# Altium schematic symbol library Capacitor - Ceramic - Sumsung.SchLib: 1421 symbols (part 5 of 8) (continued)
## CL21C102JDFNFNE (continued)
CAP CER 1000PF 200V NP0 0805; Part Number: CL21C102JDFNFNE; Manufacturer: Samsung Electro-Mechanics America, Inc.; TemperatureRange: -55C ~ 125C; TemperatureCoefficient: C0G, NP0; Tolerance: 5%; Value: 1000pF; PartId: 5983; Supplier 1: Digi-Key; Supplier Part Number 1: 1276-2982-2-ND; ComponentLink1Description: Datasheet; ComponentLink1URL: http://www.samsungsem.com/kr/support/product-search/mlcc/CL21C102JDFNFNE.jsp; ComponentLink2Description: Digi-Key listing; ComponentLink2URL: http://digikey.com/product-detail/en/CL21C102JDFNFNE/1276-2982-2-ND/3888640; Voltage: 200V; Price: 0.065; Type: -; Device Package: 0805 (2012 Metric)
footprint CAP 0805/2012
pins: 1, 2

## CL21C103JBFNNNE
designator C?, comment 10000pF
CAP CER 10000PF 50V NP0 0805; Part Number: CL21C103JBFNNNE; Manufacturer: Samsung Electro-Mechanics America, Inc.; TemperatureRange: -55C ~ 125C; TemperatureCoefficient: C0G, NP0; Tolerance: 5%; Value: 10000pF; PartId: 6062; Supplier 1: Digi-Key; Supplier Part Number 1: 1276-2984-2-ND; ComponentLink1Description: Datasheet; ComponentLink1URL: http://www.samsungsem.com/kr/support/product-search/mlcc/CL21C103JBFNNNE.jsp; ComponentLink2Description: Digi-Key listing; ComponentLink2URL: http://digikey.com/product-detail/en/CL21C103JBFNNNE/1276-2984-2-ND/3888642; Voltage: 50V; Price: 0.0947; Type: -; Device Package: 0805 (2012 Metric)
footprint CAP 0805/2012
pins: 1, 2

## CL21C120FBANNNC
designator C?, comment 12pF
CAP CER 12PF 50V NP0 0805; Part Number: CL21C120FBANNNC; Manufacturer: Samsung Electro-Mechanics America, Inc.; TemperatureRange: -55C ~ 125C; TemperatureCoefficient: C0G, NP0; Tolerance: 1%; Value: 12pF; PartId: 5882; Supplier 1: Digi-Key; Supplier Part Number 1: 1276-2579-2-ND; ComponentLink1Description: Datasheet; ComponentLink1URL: http://media.digikey.com/pdf/Data%20Sheets/Samsung%20PDFs/CL21C120FBANNNC_Spec.pdf; ComponentLink2Description: Digi-Key listing; ComponentLink2URL: http://digikey.com/product-detail/en/CL21C120FBANNNC/1276-2579-2-ND/3888237; Voltage: 50V; Price: 0.0318; Type: -; Device Package: 0805 (2012 Metric)
footprint CAP 0805/2012
pins: 1, 2

## CL21C120JBANNNC
designator C?, comment 12pF
CAP CER 12PF 50V NP0 0805; Part Number: CL21C120JBANNNC; Manufacturer: Samsung Electro-Mechanics America, Inc.; TemperatureRange: -55C ~ 125C; TemperatureCoefficient: C0G, NP0; Tolerance: 5%; Value: 12pF; PartId: 5709; Supplier 1: Digi-Key; Supplier Part Number 1: 1276-1120-2-ND; ComponentLink1Description: Datasheet; ComponentLink1URL: http://www.samsungsem.com/kr/support/product-search/mlcc/CL21C120JBANNNC.jsp; ComponentLink2Description: Digi-Key listing; ComponentLink2URL: http://digikey.com/product-detail/en/CL21C120JBANNNC/1276-1120-2-ND/3886778; Voltage: 50V; Price: 0.0132; Type: -; Device Package: 0805 (2012 Metric)
footprint CAP 0805/2012
pins: 1, 2

## CL21C121JDCNNNC
designator C?, comment 120pF
CAP CER 120PF 200V NP0 0805; Part Number: CL21C121JDCNNNC; Manufacturer: Samsung Electro-Mechanics America, Inc.; TemperatureRange: -55C ~ 125C; TemperatureCoefficient: C0G, NP0; Tolerance: 5%; Value: 120pF; PartId: 5898; Supplier 1: Digi-Key; Supplier Part Number 1: 1276-1201-2-ND; ComponentLink1Description: Datasheet; ComponentLink1URL: http://www.samsungsem.com/kr/support/product-search/mlcc/CL21C121JDCNNNC.jsp; ComponentLink2Description: Digi-Key listing; ComponentLink2URL: http://digikey.com/product-detail/en/CL21C121JDCNNNC/1276-1201-2-ND/3886859; Voltage: 200V; Price: 0.0343; Type: -; Device Package: 0805 (2012 Metric)
footprint CAP 0805/2012
pins: 1, 2

## CL21C122FBFNNWE
designator C?, comment 1200pF
CAP CER 1200PF 50V NP0 0805; Part Number: CL21C122FBFNNWE; Manufacturer: Samsung Electro-Mechanics America, Inc.; TemperatureRange: -55C ~ 125C; TemperatureCoefficient: C0G, NP0; Tolerance: 1%; Value: 1200pF; PartId: 6129; Supplier 1: Digi-Key; Supplier Part Number 1: 1276-2985-2-ND; ComponentLink1Description: Datasheet; ComponentLink1URL: http://www.samsungsem.com/global/front/downloadcms.do?path=%2F%2Fglobal%2F%2Fsupport%2F%2Flibrary%2F%2Fproduct-catalog%2F%2F__icsFiles%2F%2Fafieldfile%2F%2F2015%2F%2F11%2F%2F18&fileName=MLCC_1.pdf; ComponentLink2Description: Digi-Key listing; ComponentLink2URL: http://digikey.com/product-detail/en/CL21C122FBFNNWE/1276-2985-2-ND/3888643; Voltage: 50V; Price: 0.2127; Type: -; Device Package: 0805 (2012 Metric)
footprint CAP 0805/2012
pins: 1, 2

## CL21C122JBFNNNE
designator C?, comment 1200pF
CAP CER 1200PF 50V NP0 0805; Part Number: CL21C122JBFNNNE; Manufacturer: Samsung Electro-Mechanics America, Inc.; TemperatureRange: -55C ~ 125C; TemperatureCoefficient: C0G, NP0; Tolerance: 5%; Value: 1200pF; PartId: 5886; Supplier 1: Digi-Key; Supplier Part Number 1: 1276-2986-2-ND; ComponentLink1Description: Datasheet; ComponentLink1URL: http://www.samsungsem.com/kr/support/product-search/mlcc/CL21C122JBFNNNE.jsp; ComponentLink2Description: Digi-Key listing; ComponentLink2URL: http://digikey.com/product-detail/en/CL21C122JBFNNNE/1276-2986-2-ND/3888644; Voltage: 50V; Price: 0.032; Type: -; Device Package: 0805 (2012 Metric)
footprint CAP 0805/2012
pins: 1, 2

## CL21C130JBANNNC
designator C?, comment 13pF
CAP CER 13PF 50V NP0 0805; Part Number: CL21C130JBANNNC; Manufacturer: Samsung Electro-Mechanics America, Inc.; TemperatureRange: -55C ~ 125C; TemperatureCoefficient: C0G, NP0; Tolerance: 5%; Value: 13pF; PartId: 5672; Supplier 1: Digi-Key; Supplier Part Number 1: 1276-2582-2-ND; ComponentLink1Description: Datasheet; ComponentLink1URL: http://www.samsungsem.com/kr/support/product-search/mlcc/CL21C130JBANNNC.jsp; ComponentLink2Description: Digi-Key listing; ComponentLink2URL: http://digikey.com/product-detail/en/CL21C130JBANNNC/1276-2582-2-ND/3888240; Voltage: 50V; Price: 0.0054; Type: -; Device Package: 0805 (2012 Metric)
footprint CAP 0805/2012
pins: 1, 2

## CL21C140JBANNNC
designator C?, comment 14pF
CAP CER 14PF 50V NP0 0805; Part Number: CL21C140JBANNNC; Manufacturer: Samsung Electro-Mechanics America, Inc.; TemperatureRange: -55C ~ 125C; TemperatureCoefficient: C0G, NP0; Tolerance: 5%; Value: 14pF; PartId: 5683; Supplier 1: Digi-Key; Supplier Part Number 1: 1276-2584-2-ND; ComponentLink1Description: Datasheet; ComponentLink1URL: http://www.samsungsem.com/kr/support/product-search/mlcc/CL21C140JBANNNC.jsp; ComponentLink2Description: Digi-Key listing; ComponentLink2URL: http://digikey.com/product-detail/en/CL21C140JBANNNC/1276-2584-2-ND/3888242; Voltage: 50V; Price: 0.0061; Type: -; Device Package: 0805 (2012 Metric)
footprint CAP 0805/2012
pins: 1, 2

## CL21C150JBANNNC
designator C?, comment 15pF
CAP CER 15PF 50V NP0 0805; Part Number: CL21C150JBANNNC; Manufacturer: Samsung Electro-Mechanics America, Inc.; TemperatureRange: -55C ~ 125C; TemperatureCoefficient: C0G, NP0; Tolerance: 5%; Value: 15pF; PartId: 5747; Supplier 1: Digi-Key; Supplier Part Number 1: 1276-1163-2-ND; ComponentLink1Description: Datasheet; ComponentLink1URL: http://www.samsungsem.com/kr/support/product-search/mlcc/CL21C150JBANNNC.jsp; ComponentLink2Description: Digi-Key listing; ComponentLink2URL: http://digikey.com/product-detail/en/CL21C150JBANNNC/1276-1163-2-ND/3886821; Voltage: 50V; Price: 0.0163; Type: -; Device Package: 0805 (2012 Metric)
footprint CAP 0805/2012
pins: 1, 2

## CL21C150JCANNNC
designator C?, comment 15pF
CAP CER 15PF 100V NP0 0805; Part Number: CL21C150JCANNNC; Manufacturer: Samsung Electro-Mechanics America, Inc.; TemperatureRange: -55C ~ 125C; TemperatureCoefficient: C0G, NP0; Tolerance: 5%; Value: 15pF; PartId: 5838; Supplier 1: Digi-Key; Supplier Part Number 1: 1276-2587-2-ND; ComponentLink1Description: Datasheet; ComponentLink1URL: http://www.samsungsem.com/kr/support/product-search/mlcc/CL21C150JCANNNC.jsp; ComponentLink2Description: Digi-Key listing; ComponentLink2URL: http://digikey.com/product-detail/en/CL21C150JCANNNC/1276-2587-2-ND/3888245; Voltage: 100V; Price: 0.0235; Type: -; Device Package: 0805 (2012 Metric)
footprint CAP 0805/2012
pins: 1, 2

## CL21C151GBANNNC
designator C?, comment 150pF
CAP CER 150PF 50V NP0 0805; Part Number: CL21C151GBANNNC; Manufacturer: Samsung Electro-Mechanics America, Inc.; TemperatureRange: -55C ~ 125C; TemperatureCoefficient: C0G, NP0; Tolerance: 2%; Value: 150pF; PartId: 5933; Supplier 1: Digi-Key; Supplier Part Number 1: 1276-2589-2-ND; ComponentLink1Description: Datasheet; ComponentLink1URL: http://www.samsungsem.com/kr/support/product-search/mlcc/CL21C151GBANNNC.jsp; ComponentLink2Description: Digi-Key listing; ComponentLink2URL: http://digikey.com/product-detail/en/CL21C151GBANNNC/1276-2589-2-ND/3888247; Voltage: 50V; Price: 0.043; Type: -; Device Package: 0805 (2012 Metric)
footprint CAP 0805/2012
pins: 1, 2

## CL21C151JCANNNC
designator C?, comment 150pF
CAP CER 150PF 100V NP0 0805; Part Number: CL21C151JCANNNC; Manufacturer: Samsung Electro-Mechanics America, Inc.; TemperatureRange: -55C ~ 125C; TemperatureCoefficient: C0G, NP0; Tolerance: 5%; Value: 150pF; PartId: 5896; Supplier 1: Digi-Key; Supplier Part Number 1: 1276-2591-2-ND; ComponentLink1Description: Datasheet; ComponentLink1URL: http://www.samsungsem.com/kr/support/product-search/mlcc/CL21C151JCANNNC.jsp; ComponentLink2Description: Digi-Key listing; ComponentLink2URL: http://digikey.com/product-detail/en/CL21C151JCANNNC/1276-2591-2-ND/3888249; Voltage: 100V; Price: 0.034; Type: -; Device Package: 0805 (2012 Metric)
footprint CAP 0805/2012
pins: 1, 2

## CL21C160JBANNNC
designator C?, comment 16pF
CAP CER 16PF 50V NP0 0805; Part Number: CL21C160JBANNNC; Manufacturer: Samsung Electro-Mechanics America, Inc.; TemperatureRange: -55C ~ 125C; TemperatureCoefficient: C0G, NP0; Tolerance: 5%; Value: 16pF; PartId: 5674; Supplier 1: Digi-Key; Supplier Part Number 1: 1276-2592-2-ND; ComponentLink1Description: Datasheet; ComponentLink1URL: http://www.samsungsem.com/kr/support/product-search/mlcc/CL21C160JBANNNC.jsp; ComponentLink2Description: Digi-Key listing; ComponentLink2URL: http://digikey.com/product-detail/en/CL21C160JBANNNC/1276-2592-2-ND/3888250; Voltage: 50V; Price: 0.0054; Type: -; Device Package: 0805 (2012 Metric)
footprint CAP 0805/2012
pins: 1, 2

## CL21C161JBANNNC
designator C?, comment 160pF
CAP CER 160PF 50V NP0 0805; Part Number: CL21C161JBANNNC; Manufacturer: Samsung Electro-Mechanics America, Inc.; TemperatureRange: -55C ~ 125C; TemperatureCoefficient: C0G, NP0; Tolerance: 5%; Value: 160pF; PartId: 5817; Supplier 1: Digi-Key; Supplier Part Number 1: 1276-2593-2-ND; ComponentLink1Description: Datasheet; ComponentLink1URL: http://www.samsungsem.com/kr/support/product-search/mlcc/CL21C161JBANNNC.jsp; ComponentLink2Description: Digi-Key listing; ComponentLink2URL: http://digikey.com/product-detail/en/CL21C161JBANNNC/1276-2593-2-ND/3888251; Voltage: 50V; Price: 0.0211; Type: -; Device Package: 0805 (2012 Metric)
footprint CAP 0805/2012
pins: 1, 2

## CL21C180JBANNNC
designator C?, comment 18pF
CAP CER 18PF 50V NP0 0805; Part Number: CL21C180JBANNNC; Manufacturer: Samsung Electro-Mechanics America, Inc.; TemperatureRange: -55C ~ 125C; TemperatureCoefficient: C0G, NP0; Tolerance: 5%; Value: 18pF; PartId: 5707; Supplier 1: Digi-Key; Supplier Part Number 1: 1276-1107-2-ND; ComponentLink1Description: Datasheet; ComponentLink1URL: http://www.samsungsem.com/kr/support/product-search/mlcc/CL21C180JBANNNC.jsp; ComponentLink2Description: Digi-Key listing; ComponentLink2URL: http://digikey.com/product-detail/en/CL21C180JBANNNC/1276-1107-2-ND/3886765; Voltage: 50V; Price: 0.0132; Type: -; Device Package: 0805 (2012 Metric)
footprint CAP 0805/2012
pins: 1, 2

## CL21C181JBANNNC
designator C?, comment 180pF
CAP CER 180PF 50V NP0 0805; Part Number: CL21C181JBANNNC; Manufacturer: Samsung Electro-Mechanics America, Inc.; TemperatureRange: -55C ~ 125C; TemperatureCoefficient: C0G, NP0; Tolerance: 5%; Value: 180pF; PartId: 5785; Supplier 1: Digi-Key; Supplier Part Number 1: 1276-1129-2-ND; ComponentLink1Description: Datasheet; ComponentLink1URL: http://www.samsungsem.com/kr/support/product-search/mlcc/CL21C181JBANNNC.jsp; ComponentLink2Description: Digi-Key listing; ComponentLink2URL: http://digikey.com/product-detail/en/CL21C181JBANNNC/1276-1129-2-ND/3886787; Voltage: 50V; Price: 0.0173; Type: -; Device Package: 0805 (2012 Metric)
footprint CAP 0805/2012
pins: 1, 2

## CL21C200JBANNNC
designator C?, comment 20pF
CAP CER 20PF 50V NP0 0805; Part Number: CL21C200JBANNNC; Manufacturer: Samsung Electro-Mechanics America, Inc.; TemperatureRange: -55C ~ 125C; TemperatureCoefficient: C0G, NP0; Tolerance: 5%; Value: 20pF; PartId: 5751; Supplier 1: Digi-Key; Supplier Part Number 1: 1276-1829-2-ND; ComponentLink1Description: Datasheet; ComponentLink1URL: http://www.samsungsem.com/kr/support/product-search/mlcc/CL21C200JBANNNC.jsp; ComponentLink2Description: Digi-Key listing; ComponentLink2URL: http://digikey.com/product-detail/en/CL21C200JBANNNC/1276-1829-2-ND/3887487; Voltage: 50V; Price: 0.0163; Type: -; Device Package: 0805 (2012 Metric)
footprint CAP 0805/2012
pins: 1, 2

## CL21C201JBANNNC
designator C?, comment 200pF
CAP CER 200PF 50V NP0 0805; Part Number: CL21C201JBANNNC; Manufacturer: Samsung Electro-Mechanics America, Inc.; TemperatureRange: -55C ~ 125C; TemperatureCoefficient: C0G, NP0; Tolerance: 5%; Value: 200pF; PartId: 5798; Supplier 1: Digi-Key; Supplier Part Number 1: 1276-2601-2-ND; ComponentLink1Description: Datasheet; ComponentLink1URL: http://www.samsungsem.com/kr/support/product-search/mlcc/CL21C201JBANNNC.jsp; ComponentLink2Description: Digi-Key listing; ComponentLink2URL: http://digikey.com/product-detail/en/CL21C201JBANNNC/1276-2601-2-ND/3888259; Voltage: 50V; Price: 0.0183; Type: -; Device Package: 0805 (2012 Metric)
footprint CAP 0805/2012
pins: 1, 2

## CL21C220FBANNNC
designator C?, comment 22pF
CAP CER 22PF 50V NP0 0805; Part Number: CL21C220FBANNNC; Manufacturer: Samsung Electro-Mechanics America, Inc.; TemperatureRange: -55C ~ 125C; TemperatureCoefficient: C0G, NP0; Tolerance: 1%; Value: 22pF; PartId: 6034; Supplier 1: Digi-Key; Supplier Part Number 1: 1276-2602-2-ND; ComponentLink1Description: Datasheet; ComponentLink1URL: http://media.digikey.com/pdf/Data%20Sheets/Samsung%20PDFs/CL21C220FBANNNC_Spec.pdf; ComponentLink2Description: Digi-Key listing; ComponentLink2URL: http://digikey.com/product-detail/en/CL21C220FBANNNC/1276-2602-2-ND/3888260; Voltage: 50V; Price: 0.0774; Type: -; Device Package: 0805 (2012 Metric)
footprint CAP 0805/2012
pins: 1, 2

## CL21C220GBANNNC
designator C?, comment 22pF
CAP CER 22PF 50V NP0 0805; Part Number: CL21C220GBANNNC; Manufacturer: Samsung Electro-Mechanics America, Inc.; TemperatureRange: -55C ~ 125C; TemperatureCoefficient: C0G, NP0; Tolerance: 2%; Value: 22pF; PartId: 5899; Supplier 1: Digi-Key; Supplier Part Number 1: 1276-2604-2-ND; ComponentLink1Description: Datasheet; ComponentLink1URL: http://www.samsungsem.com/kr/support/product-search/mlcc/CL21C220GBANNNC.jsp; ComponentLink2Description: Digi-Key listing; ComponentLink2URL: http://digikey.com/product-detail/en/CL21C220GBANNNC/1276-2604-2-ND/3888262; Voltage: 50V; Price: 0.0343; Type: -; Device Package: 0805 (2012 Metric)
footprint CAP 0805/2012
pins: 1, 2

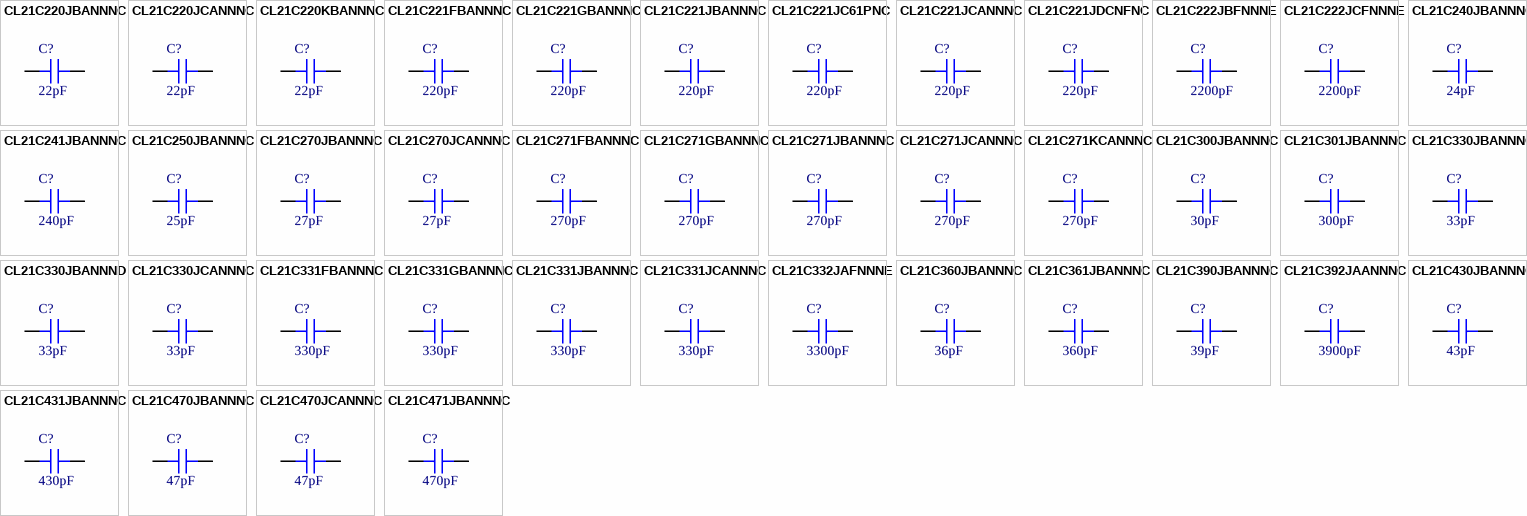
[diagram p22: symbols CL21C220JBANNNC to CL21C471JBANNNC]

## CL21C220JBANNNC
designator C?, comment 22pF
CAP CER 22PF 50V NP0 0805; Part Number: CL21C220JBANNNC; Manufacturer: Samsung Electro-Mechanics America, Inc.; TemperatureRange: -55C ~ 125C; TemperatureCoefficient: C0G, NP0; Tolerance: 5%; Value: 22pF; PartId: 13917; Supplier 1: Digi-Key; Supplier Part Number 1: 1276-1047-2-ND; ComponentLink1Description: Datasheet; ComponentLink1URL: http://www.samsungsem.com/kr/front/downloadcms.do?path=/kr/support/product-search/mlcc/__icsFiles/afieldfile/2014/11/05&fileName=C_CL21C220JBANNNC.pdf; ComponentLink2Description: Digi-Key Listing; ComponentLink2URL: https://www.digikey.com/product-detail/en/samsung-electro-mechanics-america-inc/CL21C220JBANNNC/1276-1047-2-ND/3886705; Voltage: 50V; Price: 0.0092; Device Package: 0805 (2012 Metric)
footprint CAP 0805/2012
pins: 1, 2

## CL21C220JCANNNC
designator C?, comment 22pF
CAP CER 22PF 100V NP0 0805; Part Number: CL21C220JCANNNC; Manufacturer: Samsung Electro-Mechanics America, Inc.; TemperatureRange: -55C ~ 125C; TemperatureCoefficient: C0G, NP0; Tolerance: 5%; Value: 22pF; PartId: 5778; Supplier 1: Digi-Key; Supplier Part Number 1: 1276-2607-2-ND; ComponentLink1Description: Datasheet; ComponentLink1URL: http://www.samsungsem.com/kr/support/product-search/mlcc/CL21C220JCANNNC.jsp; ComponentLink2Description: Digi-Key listing; ComponentLink2URL: http://digikey.com/product-detail/en/CL21C220JCANNNC/1276-2607-2-ND/3888265; Voltage: 100V; Price: 0.0165; Type: -; Device Package: 0805 (2012 Metric)
footprint CAP 0805/2012
pins: 1, 2

## CL21C220KBANNNC
designator C?, comment 22pF
CAP CER 22PF 50V NP0 0805; Part Number: CL21C220KBANNNC; Manufacturer: Samsung Electro-Mechanics America, Inc.; TemperatureRange: -55C ~ 125C; TemperatureCoefficient: C0G, NP0; Tolerance: 10%; Value: 22pF; PartId: 5711; Supplier 1: Digi-Key; Supplier Part Number 1: 1276-2609-2-ND; ComponentLink1Description: Datasheet; ComponentLink1URL: http://www.samsungsem.com/kr/support/product-search/mlcc/CL21C220KBANNNC.jsp; ComponentLink2Description: Digi-Key listing; ComponentLink2URL: http://digikey.com/product-detail/en/CL21C220KBANNNC/1276-2609-2-ND/3888267; Voltage: 50V; Price: 0.0132; Type: -; Device Package: 0805 (2012 Metric)
footprint CAP 0805/2012
pins: 1, 2

## CL21C221FBANNNC
designator C?, comment 220pF
CAP CER 220PF 50V NP0 0805; Part Number: CL21C221FBANNNC; Manufacturer: Samsung Electro-Mechanics America, Inc.; TemperatureRange: -55C ~ 125C; TemperatureCoefficient: C0G, NP0; Tolerance: 1%; Value: 220pF; PartId: 6066; Supplier 1: Digi-Key; Supplier Part Number 1: 1276-2610-2-ND; ComponentLink1Description: Datasheet; ComponentLink1URL: http://media.digikey.com/pdf/Data%20Sheets/Samsung%20PDFs/CL21C221FBANNNC_Spec.pdf; ComponentLink2Description: Digi-Key listing; ComponentLink2URL: http://digikey.com/product-detail/en/CL21C221FBANNNC/1276-2610-2-ND/3888268; Voltage: 50V; Price: 0.098; Type: -; Device Package: 0805 (2012 Metric)
footprint CAP 0805/2012
pins: 1, 2

## CL21C221GBANNNC
designator C?, comment 220pF
CAP CER 220PF 50V NP0 0805; Part Number: CL21C221GBANNNC; Manufacturer: Samsung Electro-Mechanics America, Inc.; TemperatureRange: -55C ~ 125C; TemperatureCoefficient: C0G, NP0; Tolerance: 2%; Value: 220pF; PartId: 6020; Supplier 1: Digi-Key; Supplier Part Number 1: 1276-2611-2-ND; ComponentLink1Description: Datasheet; ComponentLink1URL: http://www.samsungsem.com/kr/support/product-search/mlcc/CL21C221GBANNNC.jsp; ComponentLink2Description: Digi-Key listing; ComponentLink2URL: http://digikey.com/product-detail/en/CL21C221GBANNNC/1276-2611-2-ND/3888269; Voltage: 50V; Price: 0.0721; Type: -; Device Package: 0805 (2012 Metric)
footprint CAP 0805/2012
pins: 1, 2

## CL21C221JBANNNC
designator C?, comment 220pF
CAP CER 220PF 50V NP0 0805; Part Number: CL21C221JBANNNC; Manufacturer: Samsung Electro-Mechanics America, Inc.; TemperatureRange: -55C ~ 125C; TemperatureCoefficient: C0G, NP0; Tolerance: 5%; Value: 220pF; PartId: 5776; Supplier 1: Digi-Key; Supplier Part Number 1: 1276-1164-2-ND; ComponentLink1Description: Datasheet; ComponentLink1URL: http://www.samsungsem.com/kr/support/product-search/mlcc/CL21C221JBANNNC.jsp; ComponentLink2Description: Digi-Key listing; ComponentLink2URL: http://digikey.com/product-detail/en/CL21C221JBANNNC/1276-1164-2-ND/3886822; Voltage: 50V; Price: 0.0165; Type: -; Device Package: 0805 (2012 Metric)
footprint CAP 0805/2012
pins: 1, 2

## CL21C221JC61PNC
designator C?, comment 220pF
CAP CER 220PF 100V NP0 0805; Part Number: CL21C221JC61PNC; Manufacturer: Samsung Electro-Mechanics America, Inc.; TemperatureRange: -55C ~ 125C; TemperatureCoefficient: C0G, NP0; Tolerance: 5%; Value: 220pF; PartId: 14348; Supplier 1: Digi-Key; Supplier Part Number 1: 1276-2614-2-ND; ComponentLink1Description: Datasheet; ComponentLink1URL: //media.digikey.com/pdf/Data%20Sheets/Samsung%20PDFs/CL21C221JC61PNC_Spec.pdf; ComponentLink2Description: Digi-Key Listing; ComponentLink2URL: https://www.digikey.com/product-detail/en/samsung-electro-mechanics-america-inc/CL21C221JC61PNC/1276-2614-2-ND/3888272; Voltage: 100V; Price: 0.0309; Device Package: 0805 (2012 Metric)
footprint CAP 0805/2012
pins: 1, 2

## CL21C221JCANNNC
designator C?, comment 220pF
CAP CER 220PF 100V NP0 0805; Part Number: CL21C221JCANNNC; Manufacturer: Samsung Electro-Mechanics America, Inc.; TemperatureRange: -55C ~ 125C; TemperatureCoefficient: C0G, NP0; Tolerance: 5%; Value: 220pF; PartId: 5895; Supplier 1: Digi-Key; Supplier Part Number 1: 1276-2615-2-ND; ComponentLink1Description: Datasheet; ComponentLink1URL: http://www.samsungsem.com/kr/support/product-search/mlcc/CL21C221JCANNNC.jsp; ComponentLink2Description: Digi-Key listing; ComponentLink2URL: http://digikey.com/product-detail/en/CL21C221JCANNNC/1276-2615-2-ND/3888273; Voltage: 100V; Price: 0.034; Type: -; Device Package: 0805 (2012 Metric)
footprint CAP 0805/2012
pins: 1, 2

## CL21C221JDCNFNC
designator C?, comment 220pF
CAP CER 220PF 200V NP0 0805; Part Number: CL21C221JDCNFNC; Manufacturer: Samsung Electro-Mechanics America, Inc.; TemperatureRange: -55C ~ 125C; TemperatureCoefficient: C0G, NP0; Tolerance: 5%; Value: 220pF; PartId: 5915; Supplier 1: Digi-Key; Supplier Part Number 1: 1276-2616-2-ND; ComponentLink1Description: Datasheet; ComponentLink1URL: http://www.samsungsem.com/kr/support/product-search/mlcc/CL21C221JDCNFNC.jsp; ComponentLink2Description: Digi-Key listing; ComponentLink2URL: http://digikey.com/product-detail/en/CL21C221JDCNFNC/1276-2616-2-ND/3888274; Voltage: 200V; Price: 0.0384; Type: -; Device Package: 0805 (2012 Metric)
footprint CAP 0805/2012
pins: 1, 2

## CL21C222JBFNNNE
designator C?, comment 2200pF
CAP CER 2200PF 50V NP0 0805; Part Number: CL21C222JBFNNNE; Manufacturer: Samsung Electro-Mechanics America, Inc.; TemperatureRange: -55C ~ 125C; TemperatureCoefficient: C0G, NP0; Tolerance: 5%; Value: 2200pF; PartId: 5922; Supplier 1: Digi-Key; Supplier Part Number 1: 1276-2993-2-ND; ComponentLink1Description: Datasheet; ComponentLink1URL: http://www.samsungsem.com/kr/support/product-search/mlcc/CL21C222JBFNNNE.jsp; ComponentLink2Description: Digi-Key listing; ComponentLink2URL: http://digikey.com/product-detail/en/CL21C222JBFNNNE/1276-2993-2-ND/3888651; Voltage: 50V; Price: 0.0405; Type: -; Device Package: 0805 (2012 Metric)
footprint CAP 0805/2012
pins: 1, 2

## CL21C222JCFNNNE
designator C?, comment 2200pF
CAP CER 2200PF 100V NP0 0805; Part Number: CL21C222JCFNNNE; Manufacturer: Samsung Electro-Mechanics America, Inc.; TemperatureRange: -55C ~ 125C; TemperatureCoefficient: C0G, NP0; Tolerance: 5%; Value: 2200pF; PartId: 5953; Supplier 1: Digi-Key; Supplier Part Number 1: 1276-2995-2-ND; ComponentLink1Description: Datasheet; ComponentLink1URL: http://www.samsungsem.com/kr/support/product-search/mlcc/CL21C222JCFNNNE.jsp; ComponentLink2Description: Digi-Key listing; ComponentLink2URL: http://digikey.com/product-detail/en/CL21C222JCFNNNE/1276-2995-2-ND/3888653; Voltage: 100V; Price: 0.0505; Type: -; Device Package: 0805 (2012 Metric)
footprint CAP 0805/2012
pins: 1, 2

## CL21C240JBANNNC
designator C?, comment 24pF
CAP CER 24PF 50V NP0 0805; Part Number: CL21C240JBANNNC; Manufacturer: Samsung Electro-Mechanics America, Inc.; TemperatureRange: -55C ~ 125C; TemperatureCoefficient: C0G, NP0; Tolerance: 5%; Value: 24pF; PartId: 5669; Supplier 1: Digi-Key; Supplier Part Number 1: 1276-2619-2-ND; ComponentLink1Description: Datasheet; ComponentLink1URL: http://www.samsungsem.com/kr/support/product-search/mlcc/CL21C240JBANNNC.jsp; ComponentLink2Description: Digi-Key listing; ComponentLink2URL: http://digikey.com/product-detail/en/CL21C240JBANNNC/1276-2619-2-ND/3888277; Voltage: 50V; Price: 0.0054; Type: -; Device Package: 0805 (2012 Metric)
footprint CAP 0805/2012
pins: 1, 2

## CL21C241JBANNNC
designator C?, comment 240pF
CAP CER 240PF 50V NP0 0805; Part Number: CL21C241JBANNNC; Manufacturer: Samsung Electro-Mechanics America, Inc.; TemperatureRange: -55C ~ 125C; TemperatureCoefficient: C0G, NP0; Tolerance: 5%; Value: 240pF; PartId: 5842; Supplier 1: Digi-Key; Supplier Part Number 1: 1276-2620-2-ND; ComponentLink1Description: Datasheet; ComponentLink1URL: http://www.samsungsem.com/kr/support/product-search/mlcc/CL21C241JBANNNC.jsp; ComponentLink2Description: Digi-Key listing; ComponentLink2URL: http://digikey.com/product-detail/en/CL21C241JBANNNC/1276-2620-2-ND/3888278; Voltage: 50V; Price: 0.0239; Type: -; Device Package: 0805 (2012 Metric)
footprint CAP 0805/2012
pins: 1, 2

## CL21C250JBANNNC
designator C?, comment 25pF
CAP CER 25PF 50V NP0 0805; Part Number: CL21C250JBANNNC; Manufacturer: Samsung Electro-Mechanics America, Inc.; TemperatureRange: -55C ~ 125C; TemperatureCoefficient: C0G, NP0; Tolerance: 5%; Value: 25pF; PartId: 5673; Supplier 1: Digi-Key; Supplier Part Number 1: 1276-2621-2-ND; ComponentLink1Description: Datasheet; ComponentLink1URL: http://www.samsungsem.com/kr/support/product-search/mlcc/CL21C250JBANNNC.jsp; ComponentLink2Description: Digi-Key listing; ComponentLink2URL: http://digikey.com/product-detail/en/CL21C250JBANNNC/1276-2621-2-ND/3888279; Voltage: 50V; Price: 0.0054; Type: -; Device Package: 0805 (2012 Metric)
footprint CAP 0805/2012
pins: 1, 2

## CL21C270JBANNNC
designator C?, comment 27pF
CAP CER 27PF 50V NP0 0805; Part Number: CL21C270JBANNNC; Manufacturer: Samsung Electro-Mechanics America, Inc.; TemperatureRange: -55C ~ 125C; TemperatureCoefficient: C0G, NP0; Tolerance: 5%; Value: 27pF; PartId: 5748; Supplier 1: Digi-Key; Supplier Part Number 1: 1276-1285-2-ND; ComponentLink1Description: Datasheet; ComponentLink1URL: http://www.samsungsem.com/kr/support/product-search/mlcc/CL21C270JBANNNC.jsp; ComponentLink2Description: Digi-Key listing; ComponentLink2URL: http://digikey.com/product-detail/en/CL21C270JBANNNC/1276-1285-2-ND/3886943; Voltage: 50V; Price: 0.0163; Type: -; Device Package: 0805 (2012 Metric)
footprint CAP 0805/2012
pins: 1, 2

## CL21C270JCANNNC
designator C?, comment 27pF
CAP CER 27PF 100V NP0 0805; Part Number: CL21C270JCANNNC; Manufacturer: Samsung Electro-Mechanics America, Inc.; TemperatureRange: -55C ~ 125C; TemperatureCoefficient: C0G, NP0; Tolerance: 5%; Value: 27pF; PartId: 5819; Supplier 1: Digi-Key; Supplier Part Number 1: 1276-2622-2-ND; ComponentLink1Description: Datasheet; ComponentLink1URL: http://www.samsungsem.com/kr/support/product-search/mlcc/CL21C270JCANNNC.jsp; ComponentLink2Description: Digi-Key listing; ComponentLink2URL: http://digikey.com/product-detail/en/CL21C270JCANNNC/1276-2622-2-ND/3888280; Voltage: 100V; Price: 0.0212; Type: -; Device Package: 0805 (2012 Metric)
footprint CAP 0805/2012
pins: 1, 2

## CL21C271FBANNNC
designator C?, comment 270pF
CAP CER 270PF 50V NP0 0805; Part Number: CL21C271FBANNNC; Manufacturer: Samsung Electro-Mechanics America, Inc.; TemperatureRange: -55C ~ 125C; TemperatureCoefficient: C0G, NP0; Tolerance: 1%; Value: 270pF; PartId: 6012; Supplier 1: Digi-Key; Supplier Part Number 1: 1276-2623-2-ND; ComponentLink1Description: Datasheet; ComponentLink1URL: http://media.digikey.com/pdf/Data%20Sheets/Samsung%20PDFs/CL21C271FBANNNC_Spec.pdf; ComponentLink2Description: Digi-Key listing; ComponentLink2URL: http://digikey.com/product-detail/en/CL21C271FBANNNC/1276-2623-2-ND/3888281; Voltage: 50V; Price: 0.0705; Type: -; Device Package: 0805 (2012 Metric)
footprint CAP 0805/2012
pins: 1, 2

## CL21C271GBANNNC
designator C?, comment 270pF
CAP CER 270PF 50V NP0 0805; Part Number: CL21C271GBANNNC; Manufacturer: Samsung Electro-Mechanics America, Inc.; TemperatureRange: -55C ~ 125C; TemperatureCoefficient: C0G, NP0; Tolerance: 2%; Value: 270pF; PartId: 5943; Supplier 1: Digi-Key; Supplier Part Number 1: 1276-2624-2-ND; ComponentLink1Description: Datasheet; ComponentLink1URL: http://www.samsungsem.com/kr/support/product-search/mlcc/CL21C271GBANNNC.jsp; ComponentLink2Description: Digi-Key listing; ComponentLink2URL: http://digikey.com/product-detail/en/CL21C271GBANNNC/1276-2624-2-ND/3888282; Voltage: 50V; Price: 0.0457; Type: -; Device Package: 0805 (2012 Metric)
footprint CAP 0805/2012
pins: 1, 2

## CL21C271JBANNNC
designator C?, comment 270pF
CAP CER 270PF 50V NP0 0805; Part Number: CL21C271JBANNNC; Manufacturer: Samsung Electro-Mechanics America, Inc.; TemperatureRange: -55C ~ 125C; TemperatureCoefficient: C0G, NP0; Tolerance: 5%; Value: 270pF; PartId: 14248; Supplier 1: Digi-Key; Supplier Part Number 1: 1276-1262-2-ND; ComponentLink1Description: Datasheet; ComponentLink1URL: http://www.samsungsem.com/kr/support/product-search/mlcc/CL21C271JBANNNC.jsp; ComponentLink2Description: Digi-Key Listing; ComponentLink2URL: https://www.digikey.com/product-detail/en/samsung-electro-mechanics-america-inc/CL21C271JBANNNC/1276-1262-2-ND/3886920; Voltage: 50V; Price: 0.0156; Device Package: 0805 (2012 Metric)
footprint CAP 0805/2012
pins: 1, 2

## CL21C271JCANNNC
designator C?, comment 270pF
CAP CER 270PF 100V NP0 0805; Part Number: CL21C271JCANNNC; Manufacturer: Samsung Electro-Mechanics America, Inc.; TemperatureRange: -55C ~ 125C; TemperatureCoefficient: C0G, NP0; Tolerance: 5%; Value: 270pF; PartId: 5872; Supplier 1: Digi-Key; Supplier Part Number 1: 1276-2627-2-ND; ComponentLink1Description: Datasheet; ComponentLink1URL: http://www.samsungsem.com/kr/support/product-search/mlcc/CL21C271JCANNNC.jsp; ComponentLink2Description: Digi-Key listing; ComponentLink2URL: http://digikey.com/product-detail/en/CL21C271JCANNNC/1276-2627-2-ND/3888285; Voltage: 100V; Price: 0.0297; Type: -; Device Package: 0805 (2012 Metric)
footprint CAP 0805/2012
pins: 1, 2

## CL21C271KCANNNC
designator C?, comment 270pF
CAP CER 270PF 100V NP0 0805; Part Number: CL21C271KCANNNC; Manufacturer: Samsung Electro-Mechanics America, Inc.; TemperatureRange: -55C ~ 125C; TemperatureCoefficient: C0G, NP0; Tolerance: 10%; Value: 270pF; PartId: 5926; Supplier 1: Digi-Key; Supplier Part Number 1: 1276-2628-2-ND; ComponentLink1Description: Datasheet; ComponentLink1URL: http://www.samsungsem.com/kr/support/product-search/mlcc/CL21C271KCANNNC.jsp; ComponentLink2Description: Digi-Key listing; ComponentLink2URL: http://digikey.com/product-detail/en/CL21C271KCANNNC/1276-2628-2-ND/3888286; Voltage: 100V; Price: 0.0413; Type: -; Device Package: 0805 (2012 Metric)
footprint CAP 0805/2012
pins: 1, 2

## CL21C300JBANNNC
designator C?, comment 30pF
CAP CER 30PF 50V NP0 0805; Part Number: CL21C300JBANNNC; Manufacturer: Samsung Electro-Mechanics America, Inc.; TemperatureRange: -55C ~ 125C; TemperatureCoefficient: C0G, NP0; Tolerance: 5%; Value: 30pF; PartId: 5752; Supplier 1: Digi-Key; Supplier Part Number 1: 1276-1130-2-ND; ComponentLink1Description: Datasheet; ComponentLink1URL: http://www.samsungsem.com/kr/support/product-search/mlcc/CL21C300JBANNNC.jsp; ComponentLink2Description: Digi-Key listing; ComponentLink2URL: http://digikey.com/product-detail/en/CL21C300JBANNNC/1276-1130-2-ND/3886788; Voltage: 50V; Price: 0.0163; Type: -; Device Package: 0805 (2012 Metric)
footprint CAP 0805/2012
pins: 1, 2

## CL21C301JBANNNC
designator C?, comment 300pF
CAP CER 300PF 50V NP0 0805; Part Number: CL21C301JBANNNC; Manufacturer: Samsung Electro-Mechanics America, Inc.; TemperatureRange: -55C ~ 125C; TemperatureCoefficient: C0G, NP0; Tolerance: 5%; Value: 300pF; PartId: 5866; Supplier 1: Digi-Key; Supplier Part Number 1: 1276-2636-2-ND; ComponentLink1Description: Datasheet; ComponentLink1URL: http://www.samsungsem.com/kr/support/product-search/mlcc/CL21C301JBANNNC.jsp; ComponentLink2Description: Digi-Key listing; ComponentLink2URL: http://digikey.com/product-detail/en/CL21C301JBANNNC/1276-2636-2-ND/3888294; Voltage: 50V; Price: 0.0285; Type: -; Device Package: 0805 (2012 Metric)
footprint CAP 0805/2012
pins: 1, 2

## CL21C330JBANNNC
designator C?, comment 33pF
CAP CER 33PF 50V NP0 0805; Part Number: CL21C330JBANNNC; Manufacturer: Samsung Electro-Mechanics America, Inc.; TemperatureRange: -55C ~ 125C; TemperatureCoefficient: C0G, NP0; Tolerance: 5%; Value: 33pF; PartId: 13900; Supplier 1: Digi-Key; Supplier Part Number 1: 1276-1105-2-ND; ComponentLink1Description: Datasheet; ComponentLink1URL: http://www.samsungsem.com/kr/support/product-search/mlcc/CL21C330JBANNNC.jsp; ComponentLink2Description: Digi-Key Listing; ComponentLink2URL: https://www.digikey.com/product-detail/en/samsung-electro-mechanics-america-inc/CL21C330JBANNNC/1276-1105-2-ND/3886763; Voltage: 50V; Price: 0.0092; Device Package: 0805 (2012 Metric)
footprint CAP 0805/2012
pins: 1, 2

## CL21C330JBANNND
designator C?, comment 33pF
CAP CER 33PF 50V NP0 0805; Part Number: CL21C330JBANNND; Manufacturer: Samsung Electro-Mechanics America, Inc.; TemperatureRange: -55C ~ 125C; TemperatureCoefficient: C0G, NP0; Tolerance: 5%; Value: 33pF; PartId: 5666; Supplier 1: Digi-Key; Supplier Part Number 1: CL21C330JBANNND-ND; ComponentLink1Description: Datasheet; ComponentLink1URL: http://www.samsungsem.com/kr/support/product-search/mlcc/CL21C330JBANNND.jsp; ComponentLink2Description: Digi-Key listing; ComponentLink2URL: http://digikey.com/product-detail/en/CL21C330JBANNND/CL21C330JBANNND-ND/3894595; Voltage: 50V; Price: 0.005; Type: -; Device Package: 0805 (2012 Metric)
footprint CAP 0805/2012
pins: 1, 2

## CL21C330JCANNNC
designator C?, comment 33pF
CAP CER 33PF 100V NP0 0805; Part Number: CL21C330JCANNNC; Manufacturer: Samsung Electro-Mechanics America, Inc.; TemperatureRange: -55C ~ 125C; TemperatureCoefficient: C0G, NP0; Tolerance: 5%; Value: 33pF; PartId: 5825; Supplier 1: Digi-Key; Supplier Part Number 1: 1276-2640-2-ND; ComponentLink1Description: Datasheet; ComponentLink1URL: http://www.samsungsem.com/kr/support/product-search/mlcc/CL21C330JCANNNC.jsp; ComponentLink2Description: Digi-Key listing; ComponentLink2URL: http://digikey.com/product-detail/en/CL21C330JCANNNC/1276-2640-2-ND/3888298; Voltage: 100V; Price: 0.0214; Type: -; Device Package: 0805 (2012 Metric)
footprint CAP 0805/2012
pins: 1, 2

## CL21C331FBANNNC
designator C?, comment 330pF